# Altium footprint library Connector.PcbLib: 86 footprints (part 1 of 6)
Each footprint in its own frame and in the unit in brackets; x right, y up, seen from the top. Pads: shape width x height; smd on the part's side, far side on the other; paste and mask are expansions set on the pad; w line width, h text height; cw(c..) or ccw(c..) is an arc to the next point about the centre after c.
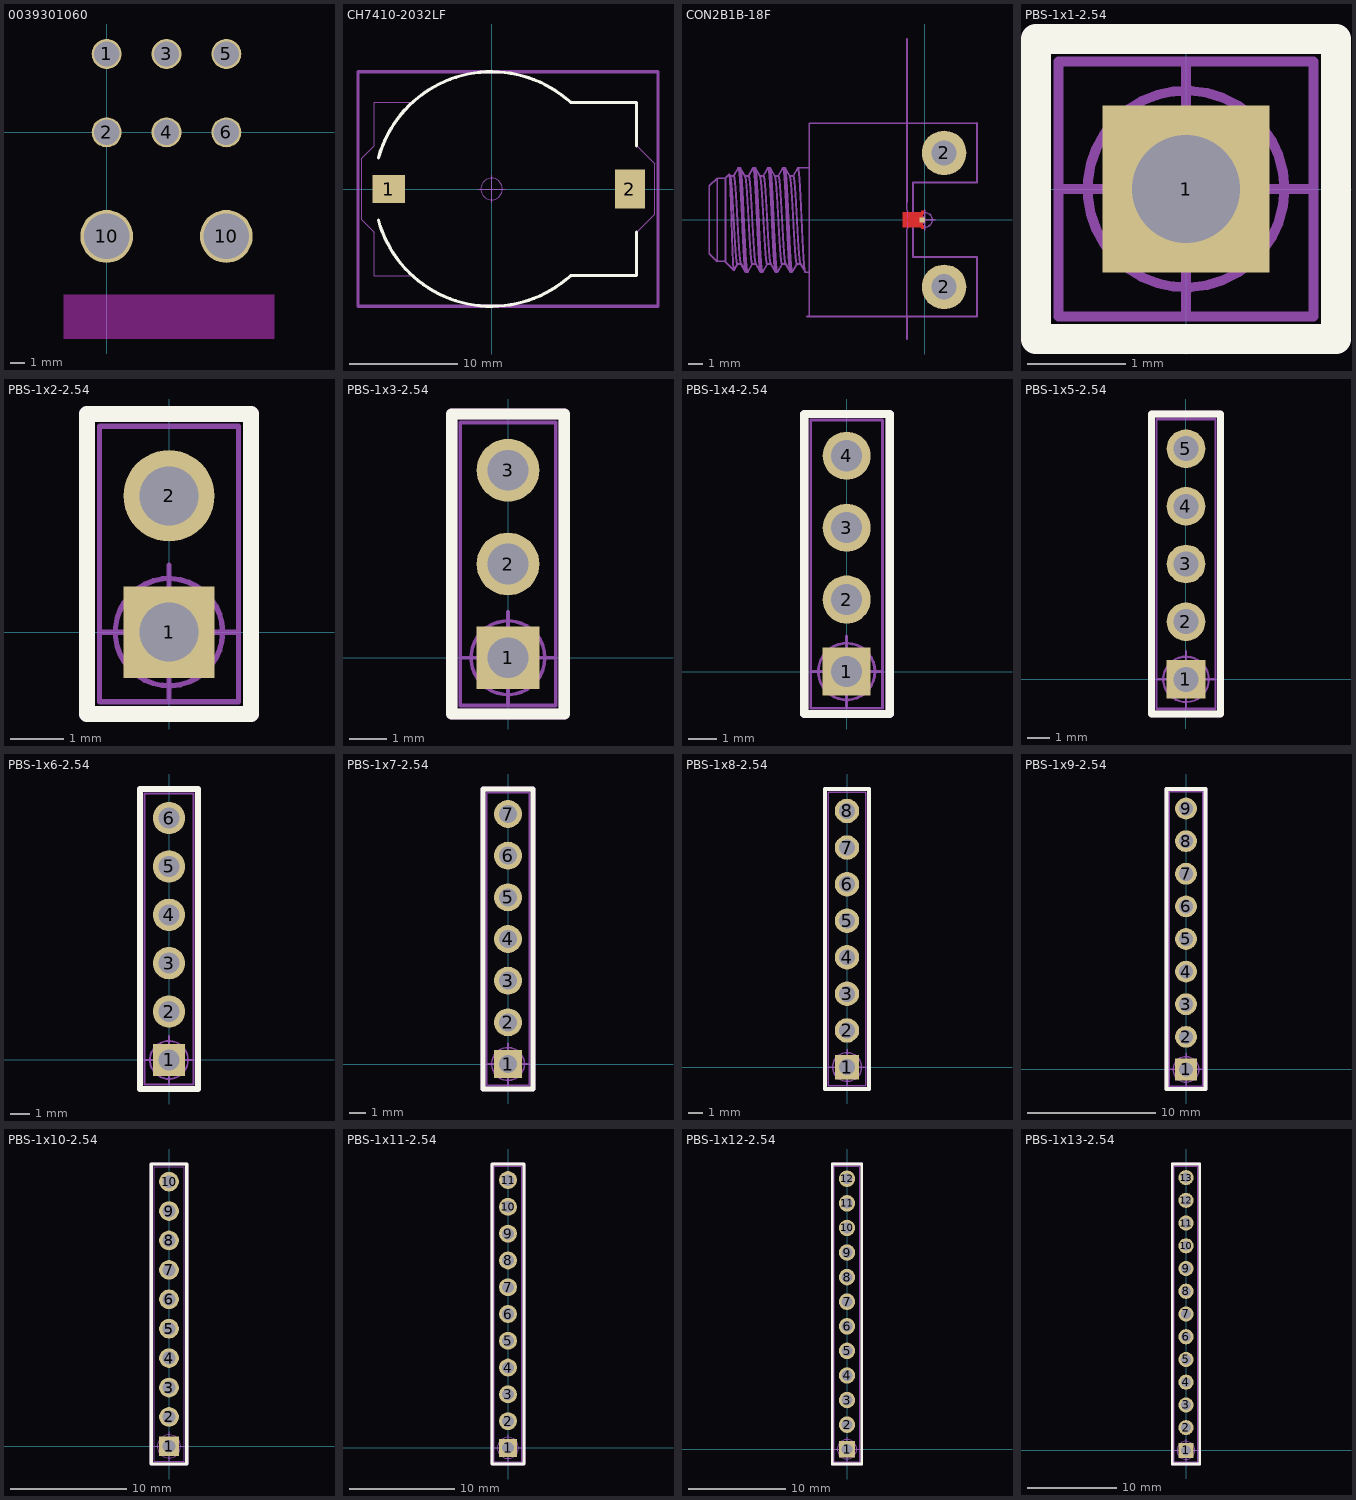
[diagram p0: the footprints below, top view; thin cyan lines are the x and y axes]

## 0039301060 [mm] "0039301060"
pads (8):
  round 2.1 hole 1.78: 1(0,5.5) 2(0,0) 3(4.2,5.5) 4(4.2,0) 5(8.4,5.5) 6(8.4,0)
  round 3.7 hole 3.2: 10(0,-7.3) 10(8.4,-7.3)
Keep-Out Layer:
  board cut-out: 11.75,-11.379 -3,-11.379 -3,-14.5 11.75,-14.5
3D body "39301060.stp": height 11.4, standoff -3.6, extent -2.7,-13.9 11.497,6.035

## CH7410-2032LF [mm]
pads (2):
  rect 3x2.6 smd: 1(-9.5,0)
  rect 2.8x3.6 smd: 2(12.8,0)
Top Overlay:
  lines w0.3: -10.458,-2.873 ccw(c0,0) 7.322,-8.001 13.411,-8.001 13.411,-4 ; -10.451,2.9 cw(c0,0) 7.322,8.001 13.411,8.001 13.411,4
Top Assembly:
  lines w0.1: -7.322,-8.001 ccw(c0,0) 7.288,-8.032 ; -7.304,-8.001 -10.846,-8.001 -10.846,-4 -11.989,-2.857 -11.989,2.857 -10.846,4 -10.846,8.001 -7.304,8.001 ; -7.304,8.018 cw(c0,0) 7.322,8.001 13.411,8.001 13.411,4 15.088,2.324 15.088,-2.324 13.411,-4 13.411,-8.001 7.322,-8.001
Top Component Outline:
  lines w0.3: -12.344,-10.845 15.392,-10.845 15.392,10.843 -12.344,10.843 -12.344,-10.845
Top Component Center:
  circle w0.1: c0,0 r1
  lines w0.1: -1.25,0 1.25,0 ; 0,-1.25 0,1.25
3D body "CH7410-2032LF.STEP": height 5.4, standoff 0, extent -10.852,-8 13.4,8

## CON2B1B-18F [mm]
pads (3):
  rect 0.355x0.355 smd mask+0: 1(-0.178,0)
  round 3 hole 1.7: 2(1.284,-4.5) 2(1.284,4.5)
Top Layer:
  rectangle: -0.259,0.35 -0.05,0.633
  rectangle: -0.259,-0.602 -0.059,-0.35
  region: -0.356,-0.178 -0.162,-0.178 -0.162,0.177 -0.356,0.177 -0.356,0.105 -1.146,0.105 -1.146,-0.105 -0.356,-0.105
  pour cut-out: -0.259,0.501 -1.478,0.501 -1.478,-0.5 -0.259,-0.5 -0.259,-0.35 -0.162,-0.35 -0.162,0.35 -0.259,0.35
Top Solder:
  rectangle: -1.225,-6.5 4,-2.475
  rectangle: -1.225,2.5 4,6.525
Keep-Out Layer:
  lines w0: -1.146,-0.5 -1.146,-0.105 ; -1.146,0.105 -1.146,0.5
Board:
  lines w0.1: -1.216,-6.502 -1.216,-0.71 -1.146,-0.51 -1.146,0.51 -1.214,0.703 -1.214,6.502
Top Assembly:
  drawing of 22333 lines, arcs and shapes, not listed
Bottom Assembly:
  lines w0.13: -1.216,-8 -1.216,-6.502 ; -1.214,1.202 -1.214,11.802 -1.214,12.152
  text "PCB Edge" at -1.873,7.015 h1
Top Component Outline:
  circle w0.127: c1.337,-4.5 r0.85
  circle w0.127: c1.337,4.5 r0.85
  lines w0.127: 1.334,-5.35 ccw(c1.331,-4.5) 1.334,-3.65 ; 1.334,3.65 ccw(c1.331,4.5) 1.334,5.35
Top Component Center:
  circle w0.1: c-0.015,0 r0.5
  lines w0.1: -0.7,0 0.697,0 ; -0.015,-0.706 -0.015,0.691
3D body "型奶.434541.008.STEP": height 5.1, standoff -4.9, extent -14.46,-6.5 3.44,6.5

## PBS-1x1-2.54 [mm]
pads (1):
  rect 1.7x1.7 hole 1.1: 1(0,0)
Top Overlay:
  lines w0.3: -1.524,-1.524 -1.524,1.524 1.524,1.524 1.524,-1.524 -1.524,-1.524
Bottom Overlay:
  lines w0.3: -1.524,-1.524 1.524,-1.524 1.524,1.524 -1.524,1.524 -1.524,-1.524
Top Assembly:
  lines w0.1: -1.295,-1.295 -1.295,1.295 1.295,1.295 1.295,-1.295 -1.295,-1.295
Top Component Outline:
  lines w0.3: -1.524,-1.524 -1.524,1.524 1.524,1.524 1.524,-1.524 -1.524,-1.524
Top Component Center:
  circle w0.1: c0,0 r1
  lines w0.1: -1.25,0 1.25,0 ; 0,-1.25 0,1.25
3D body "PBS-1x1 2.54.stp": height 8.5, standoff -3.2, extent -1.29,-1.27 1.25,1.27

## PBS-1x2-2.54 [mm]
pads (2):
  rect 1.7x1.7 hole 1.1: 1(0,0)
  round 1.7 hole 1.1: 2(0,2.54)
Top Overlay:
  lines w0.3: -1.524,-1.524 1.524,-1.524 1.524,4.064 -1.524,4.064 -1.524,-1.524
Bottom Overlay:
  lines w0.3: -1.524,-1.524 1.524,-1.524 1.524,4.064 -1.524,4.064 -1.524,-1.524
Top Assembly:
  lines w0.1: -1.295,-1.295 1.295,-1.295 1.295,3.835 -1.295,3.835 -1.295,-1.295
Top Component Outline:
  lines w0.3: -1.524,-1.524 1.524,-1.524 1.524,4.064 -1.524,4.064 -1.524,-1.524
Top Component Center:
  circle w0.1: c0,0 r1
  lines w0.1: -1.25,0 1.25,0 ; 0,-1.25 0,1.25
3D body "PBS-1x1 2.54.stp": height 8.5, standoff -3.2, extent -1.245,1.268 1.295,3.808
3D body "PBS-1x1 2.54.stp": height 8.5, standoff -3.2, extent -1.245,-1.272 1.295,1.268

## PBS-1x3-2.54 [mm]
pads (3):
  rect 1.7x1.7 hole 1.1: 1(0,0)
  round 1.7 hole 1.1: 2(0,2.54) 3(0,5.08)
Top Overlay:
  lines w0.3: -1.524,-1.524 -1.524,6.604 1.524,6.604 1.524,-1.524 -1.524,-1.524
Bottom Overlay:
  lines w0.3: -1.524,-1.524 1.524,-1.524 1.524,6.604 -1.524,6.604 -1.524,-1.524
Top Assembly:
  lines w0.1: -1.295,-1.295 1.295,-1.295 1.295,6.375 -1.295,6.375 -1.295,-1.295
Top Component Outline:
  lines w0.3: -1.524,-1.524 1.524,-1.524 1.524,6.604 -1.524,6.604 -1.524,-1.524
Top Component Center:
  circle w0.1: c0,0 r1
  lines w0.1: -1.25,0 1.25,0 ; 0,-1.25 0,1.25
3D body "PBS-1x1 2.54.stp": height 8.5, standoff -3.2, extent -1.245,-1.272 1.295,1.268
3D body "PBS-1x1 2.54.stp": height 8.5, standoff -3.2, extent -1.245,1.268 1.295,3.808
3D body "PBS-1x1 2.54.stp": height 8.5, standoff -3.2, extent -1.245,3.808 1.295,6.348

## PBS-1x4-2.54 [mm]
pads (4):
  rect 1.7x1.7 hole 1.1: 1(0,0)
  round 1.7 hole 1.1: 2(0,2.54) 3(0,5.08) 4(0,7.62)
Top Overlay:
  lines w0.3: -1.499,-1.499 -1.499,9.093 1.524,9.093 1.524,-1.499 -1.499,-1.499
Bottom Overlay:
  lines w0.3: -1.499,-1.499 -1.499,9.093 1.524,9.093 1.524,-1.499 -1.499,-1.499
Top Assembly:
  lines w0.1: -1.27,-1.295 1.266,-1.295 1.266,8.882 -1.27,8.882 -1.27,-1.295
Top Component Outline:
  lines w0.3: -1.499,-1.499 -1.499,9.093 1.524,9.093 1.524,-1.499 -1.499,-1.499
Top Component Center:
  circle w0.1: c0,0 r1
  lines w0.1: -1.25,0 1.25,0 ; 0,-1.25 0,1.25
3D body "PBS-1x1 2.54.stp": height 8.5, standoff -3.2, extent -1.245,6.348 1.295,8.888
3D body "PBS-1x1 2.54.stp": height 8.5, standoff -3.2, extent -1.245,3.808 1.295,6.348
3D body "PBS-1x1 2.54.stp": height 8.5, standoff -3.2, extent -1.245,1.268 1.295,3.808
3D body "PBS-1x1 2.54.stp": height 8.5, standoff -3.2, extent -1.245,-1.272 1.295,1.268

## PBS-1x5-2.54 [mm]
pads (5):
  rect 1.7x1.7 hole 1.1: 1(0,0)
  round 1.7 hole 1.1: 2(0,2.54) 3(0,5.08) 4(0,7.62) 5(0,10.16)
Top Overlay:
  lines w0.3: -1.524,-1.524 -1.524,11.684 1.524,11.684 1.524,-1.524 -1.524,-1.524
Bottom Overlay:
  lines w0.3: -1.524,-1.524 -1.524,11.684 1.524,11.684 1.524,-1.524 -1.524,-1.524
Top Assembly:
  lines w0.1: -1.295,-1.295 -1.295,11.455 1.295,11.455 1.295,-1.295 -1.295,-1.295
Top Component Outline:
  lines w0.3: -1.524,-1.524 -1.524,11.684 1.524,11.684 1.524,-1.524 -1.524,-1.524
Top Component Center:
  circle w0.1: c0,0 r1
  lines w0.1: -1.25,0 1.25,0 ; 0,-1.25 0,1.25
3D body "PBS-1x1 2.54.stp": height 8.5, standoff -3.2, extent -1.245,-1.272 1.295,1.268
3D body "PBS-1x1 2.54.stp": height 8.5, standoff -3.2, extent -1.245,1.268 1.295,3.808
3D body "PBS-1x1 2.54.stp": height 8.5, standoff -3.2, extent -1.245,3.808 1.295,6.348
3D body "PBS-1x1 2.54.stp": height 8.5, standoff -3.2, extent -1.245,6.348 1.295,8.888
3D body "PBS-1x1 2.54.stp": height 8.5, standoff -3.2, extent -1.245,8.888 1.295,11.428

## PBS-1x6-2.54 [mm]
pads (6):
  rect 1.7x1.7 hole 1.1: 1(0,0)
  round 1.7 hole 1.1: 2(0,2.54) 3(0,5.08) 4(0,7.62) 5(0,10.16) 6(0,12.7)
Top Overlay:
  lines w0.3: -1.524,-1.524 -1.524,14.224 1.524,14.224 1.524,-1.524 -1.524,-1.524
Bottom Overlay:
  lines w0.3: -1.524,-1.524 1.524,-1.524 1.524,14.224 -1.524,14.224 -1.524,-1.524
Top Assembly:
  lines w0.1: -1.295,-1.295 1.295,-1.295 1.295,13.995 -1.295,13.995 -1.295,-1.295
Top Component Outline:
  lines w0.3: -1.524,-1.524 -1.524,14.224 1.524,14.224 1.524,-1.524 -1.524,-1.524
Top Component Center:
  circle w0.1: c0,0 r1
  lines w0.1: -1.25,0 1.25,0 ; 0,-1.25 0,1.25
3D body "PBS-1x1 2.54.stp": height 8.5, standoff -3.2, extent -1.245,11.428 1.295,13.968
3D body "PBS-1x1 2.54.stp": height 8.5, standoff -3.2, extent -1.245,8.888 1.295,11.428
3D body "PBS-1x1 2.54.stp": height 8.5, standoff -3.2, extent -1.245,6.348 1.295,8.888
3D body "PBS-1x1 2.54.stp": height 8.5, standoff -3.2, extent -1.245,3.808 1.295,6.348
3D body "PBS-1x1 2.54.stp": height 8.5, standoff -3.2, extent -1.245,1.268 1.295,3.808
3D body "PBS-1x1 2.54.stp": height 8.5, standoff -3.2, extent -1.245,-1.272 1.295,1.268

## PBS-1x7-2.54 [mm]
pads (7):
  rect 1.7x1.7 hole 1.1: 1(0,0)
  round 1.7 hole 1.1: 2(0,2.54) 3(0,5.08) 4(0,7.62) 5(0,10.16) 6(0,12.7) 7(0,15.24)
Top Overlay:
  lines w0.3: -1.524,-1.524 -1.524,16.764 1.524,16.764 1.524,-1.524 -1.524,-1.524
Bottom Overlay:
  lines w0.3: -1.524,-1.524 1.524,-1.524 1.524,16.764 -1.524,16.764 -1.524,-1.524
Top Assembly:
  lines w0.1: -1.295,-1.295 1.295,-1.295 1.295,16.535 -1.295,16.535 -1.295,-1.295
Top Component Outline:
  lines w0.3: -1.524,-1.524 -1.524,16.764 1.524,16.764 1.524,-1.524 -1.524,-1.524
Top Component Center:
  circle w0.1: c0,0 r1
  lines w0.1: -1.25,0 1.25,0 ; 0,-1.25 0,1.25
3D body "PBS-1x1 2.54.stp": height 8.5, standoff -3.2, extent -1.245,-1.272 1.295,1.268
3D body "PBS-1x1 2.54.stp": height 8.5, standoff -3.2, extent -1.245,1.268 1.295,3.808
3D body "PBS-1x1 2.54.stp": height 8.5, standoff -3.2, extent -1.245,3.808 1.295,6.348
3D body "PBS-1x1 2.54.stp": height 8.5, standoff -3.2, extent -1.245,6.348 1.295,8.888
3D body "PBS-1x1 2.54.stp": height 8.5, standoff -3.2, extent -1.245,8.888 1.295,11.428
3D body "PBS-1x1 2.54.stp": height 8.5, standoff -3.2, extent -1.245,11.428 1.295,13.968
3D body "PBS-1x1 2.54.stp": height 8.5, standoff -3.2, extent -1.245,13.968 1.295,16.508

## PBS-1x8-2.54 [mm]
pads (8):
  rect 1.7x1.7 hole 1.1: 1(0,0)
  round 1.7 hole 1.1: 2(0,2.54) 3(0,5.08) 4(0,7.62) 5(0,10.16) 6(0,12.7) 7(0,15.24) 8(0,17.78)
Top Overlay:
  lines w0.3: -1.524,-1.524 1.524,-1.524 1.524,19.304 -1.524,19.304 -1.524,-1.524
Bottom Overlay:
  lines w0.3: -1.524,-1.524 -1.524,19.304 1.524,19.304 1.524,-1.524 -1.524,-1.524
Top Assembly:
  lines w0.1: -1.295,-1.295 -1.295,19.075 1.295,19.075 1.295,-1.295 -1.295,-1.295
Top Component Outline:
  lines w0.3: -1.524,-1.524 1.524,-1.524 1.524,19.304 -1.524,19.304 -1.524,-1.524
Top Component Center:
  circle w0.1: c0,0 r1
  lines w0.1: -1.25,0 1.25,0 ; 0,-1.25 0,1.25
3D body "PBS-1x1 2.54.stp": height 8.5, standoff -3.2, extent -1.245,16.508 1.295,19.048
3D body "PBS-1x1 2.54.stp": height 8.5, standoff -3.2, extent -1.245,13.968 1.295,16.508
3D body "PBS-1x1 2.54.stp": height 8.5, standoff -3.2, extent -1.245,11.428 1.295,13.968
3D body "PBS-1x1 2.54.stp": height 8.5, standoff -3.2, extent -1.245,8.888 1.295,11.428
3D body "PBS-1x1 2.54.stp": height 8.5, standoff -3.2, extent -1.245,6.348 1.295,8.888
3D body "PBS-1x1 2.54.stp": height 8.5, standoff -3.2, extent -1.245,3.808 1.295,6.348
3D body "PBS-1x1 2.54.stp": height 8.5, standoff -3.2, extent -1.245,1.268 1.295,3.808
3D body "PBS-1x1 2.54.stp": height 8.5, standoff -3.2, extent -1.245,-1.272 1.295,1.268

## PBS-1x9-2.54 [mm]
pads (9):
  rect 1.7x1.7 hole 1.1: 1(0,0)
  round 1.7 hole 1.1: 2(0,2.54) 3(0,5.08) 4(0,7.62) 5(0,10.16) 6(0,12.7) 7(0,15.24) 8(0,17.78) 9(0,20.32)
Top Overlay:
  lines w0.3: -1.524,-1.524 1.524,-1.524 1.524,21.844 -1.524,21.844 -1.524,-1.524
Bottom Overlay:
  lines w0.3: -1.524,-1.524 -1.524,21.844 1.524,21.844 1.524,-1.524 -1.524,-1.524
Top Assembly:
  lines w0.1: -1.295,-1.295 1.295,-1.295 1.295,21.615 -1.295,21.615 -1.295,-1.295
Top Component Outline:
  lines w0.3: -1.524,-1.524 1.524,-1.524 1.524,21.844 -1.524,21.844 -1.524,-1.524
Top Component Center:
  circle w0.1: c0,0 r1
  lines w0.1: -1.25,0 1.25,0 ; 0,-1.25 0,1.25
3D body "PBS-1x1 2.54.stp": height 8.5, standoff -3.2, extent -1.245,19.048 1.295,21.588
3D body "PBS-1x1 2.54.stp": height 8.5, standoff -3.2, extent -1.245,16.508 1.295,19.048
3D body "PBS-1x1 2.54.stp": height 8.5, standoff -3.2, extent -1.245,13.968 1.295,16.508
3D body "PBS-1x1 2.54.stp": height 8.5, standoff -3.2, extent -1.245,11.428 1.295,13.968
3D body "PBS-1x1 2.54.stp": height 8.5, standoff -3.2, extent -1.245,8.888 1.295,11.428
3D body "PBS-1x1 2.54.stp": height 8.5, standoff -3.2, extent -1.245,6.348 1.295,8.888
3D body "PBS-1x1 2.54.stp": height 8.5, standoff -3.2, extent -1.245,3.808 1.295,6.348
3D body "PBS-1x1 2.54.stp": height 8.5, standoff -3.2, extent -1.245,1.268 1.295,3.808
3D body "PBS-1x1 2.54.stp": height 8.5, standoff -3.2, extent -1.245,-1.272 1.295,1.268

## PBS-1x10-2.54 [mm]
pads (10):
  rect 1.7x1.7 hole 1.1: 1(0,0)
  round 1.7 hole 1.1: 2(0,2.54) 3(0,5.08) 4(0,7.62) 5(0,10.16) 6(0,12.7) 7(0,15.24) 8(0,17.78) 9(0,20.32) 10(0,22.86)
Top Overlay:
  lines w0.3: -1.524,-1.524 1.524,-1.524 1.524,24.384 -1.524,24.384 -1.524,-1.524
Bottom Overlay:
  lines w0.3: -1.524,-1.524 -1.524,24.384 1.524,24.384 1.524,-1.524 -1.524,-1.524
Top Assembly:
  lines w0.1: -1.295,-1.295 -1.295,24.155 1.295,24.155 1.295,-1.295 -1.295,-1.295
Top Component Outline:
  lines w0.3: -1.524,-1.524 1.524,-1.524 1.524,24.384 -1.524,24.384 -1.524,-1.524
Top Component Center:
  circle w0.1: c0,0 r1
  lines w0.1: -1.25,0 1.25,0 ; 0,-1.25 0,1.25
3D body "PBS-1x1 2.54.stp": height 8.5, standoff -3.2, extent -1.245,21.588 1.295,24.128
3D body "PBS-1x1 2.54.stp": height 8.5, standoff -3.2, extent -1.245,19.048 1.295,21.588
3D body "PBS-1x1 2.54.stp": height 8.5, standoff -3.2, extent -1.245,16.508 1.295,19.048
3D body "PBS-1x1 2.54.stp": height 8.5, standoff -3.2, extent -1.245,13.968 1.295,16.508
3D body "PBS-1x1 2.54.stp": height 8.5, standoff -3.2, extent -1.245,11.428 1.295,13.968
3D body "PBS-1x1 2.54.stp": height 8.5, standoff -3.2, extent -1.245,8.888 1.295,11.428
3D body "PBS-1x1 2.54.stp": height 8.5, standoff -3.2, extent -1.245,6.348 1.295,8.888
3D body "PBS-1x1 2.54.stp": height 8.5, standoff -3.2, extent -1.245,3.808 1.295,6.348
3D body "PBS-1x1 2.54.stp": height 8.5, standoff -3.2, extent -1.245,1.268 1.295,3.808
3D body "PBS-1x1 2.54.stp": height 8.5, standoff -3.2, extent -1.245,-1.272 1.295,1.268

## PBS-1x11-2.54 [mm]
pads (11):
  rect 1.7x1.7 hole 1.1: 1(0,0)
  round 1.7 hole 1.1: 2(0,2.54) 3(0,5.08) 4(0,7.62) 5(0,10.16) 6(0,12.7) 7(0,15.24) 8(0,17.78) 9(0,20.32) 10(0,22.86) 11(0,25.4)
Top Overlay:
  lines w0.3: -1.524,-1.524 1.524,-1.524 1.524,26.924 -1.524,26.924 -1.524,-1.524
Bottom Overlay:
  lines w0.3: -1.524,-1.524 1.524,-1.524 1.524,26.924 -1.524,26.924 -1.524,-1.524
Top Assembly:
  lines w0.1: -1.295,-1.295 1.295,-1.295 1.295,26.695 -1.295,26.695 -1.295,-1.295
Top Component Outline:
  lines w0.3: -1.524,-1.524 1.524,-1.524 1.524,26.924 -1.524,26.924 -1.524,-1.524
Top Component Center:
  circle w0.1: c0,0 r1
  lines w0.1: -1.25,0 1.25,0 ; 0,-1.25 0,1.25
3D body "PBS-1x1 2.54.stp": height 8.5, standoff -3.2, extent -1.245,-1.272 1.295,1.268
3D body "PBS-1x1 2.54.stp": height 8.5, standoff -3.2, extent -1.245,1.268 1.295,3.808
3D body "PBS-1x1 2.54.stp": height 8.5, standoff -3.2, extent -1.245,3.808 1.295,6.348
3D body "PBS-1x1 2.54.stp": height 8.5, standoff -3.2, extent -1.245,6.348 1.295,8.888
3D body "PBS-1x1 2.54.stp": height 8.5, standoff -3.2, extent -1.245,8.888 1.295,11.428
3D body "PBS-1x1 2.54.stp": height 8.5, standoff -3.2, extent -1.245,11.428 1.295,13.968
3D body "PBS-1x1 2.54.stp": height 8.5, standoff -3.2, extent -1.245,13.968 1.295,16.508
3D body "PBS-1x1 2.54.stp": height 8.5, standoff -3.2, extent -1.245,16.508 1.295,19.048
3D body "PBS-1x1 2.54.stp": height 8.5, standoff -3.2, extent -1.245,19.048 1.295,21.588
3D body "PBS-1x1 2.54.stp": height 8.5, standoff -3.2, extent -1.245,21.588 1.295,24.128
3D body "PBS-1x1 2.54.stp": height 8.5, standoff -3.2, extent -1.245,24.128 1.295,26.668

## PBS-1x12-2.54 [mm]
pads (12):
  rect 1.7x1.7 hole 1.1: 1(0,0)
  round 1.7 hole 1.1: 2(0,2.54) 3(0,5.08) 4(0,7.62) 5(0,10.16) 6(0,12.7) 7(0,15.24) 8(0,17.78) 9(0,20.32) 10(0,22.86) 11(0,25.4) 12(0,27.94)
Top Overlay:
  lines w0.3: -1.524,-1.524 -1.524,29.464 1.524,29.464 1.524,-1.524 -1.524,-1.524
Bottom Overlay:
  lines w0.3: -1.524,-1.524 -1.524,29.464 1.524,29.464 1.524,-1.524 -1.524,-1.524
Top Assembly:
  lines w0.1: -1.295,-1.295 1.295,-1.295 1.295,29.235 -1.295,29.235 -1.295,-1.295
Top Component Outline:
  lines w0.3: -1.524,-1.524 -1.524,29.464 1.524,29.464 1.524,-1.524 -1.524,-1.524
Top Component Center:
  circle w0.1: c0,0 r1
  lines w0.1: -1.25,0 1.25,0 ; 0,-1.25 0,1.25
3D body "PBS-1x1 2.54.stp": height 8.5, standoff -3.2, extent -1.245,26.668 1.295,29.208
3D body "PBS-1x1 2.54.stp": height 8.5, standoff -3.2, extent -1.245,24.128 1.295,26.668
3D body "PBS-1x1 2.54.stp": height 8.5, standoff -3.2, extent -1.245,21.588 1.295,24.128
3D body "PBS-1x1 2.54.stp": height 8.5, standoff -3.2, extent -1.245,19.048 1.295,21.588
3D body "PBS-1x1 2.54.stp": height 8.5, standoff -3.2, extent -1.245,16.508 1.295,19.048
3D body "PBS-1x1 2.54.stp": height 8.5, standoff -3.2, extent -1.245,13.968 1.295,16.508
3D body "PBS-1x1 2.54.stp": height 8.5, standoff -3.2, extent -1.245,11.428 1.295,13.968
3D body "PBS-1x1 2.54.stp": height 8.5, standoff -3.2, extent -1.245,8.888 1.295,11.428
3D body "PBS-1x1 2.54.stp": height 8.5, standoff -3.2, extent -1.245,6.348 1.295,8.888
3D body "PBS-1x1 2.54.stp": height 8.5, standoff -3.2, extent -1.245,3.808 1.295,6.348
3D body "PBS-1x1 2.54.stp": height 8.5, standoff -3.2, extent -1.245,1.268 1.295,3.808
3D body "PBS-1x1 2.54.stp": height 8.5, standoff -3.2, extent -1.245,-1.272 1.295,1.268

## PBS-1x13-2.54 [mm]
pads (13):
  rect 1.7x1.7 hole 1.1: 1(0,0)
  round 1.7 hole 1.1: 2(0,2.54) 3(0,5.08) 4(0,7.62) 5(0,10.16) 6(0,12.7) 7(0,15.24) 8(0,17.78) 9(0,20.32) 10(0,22.86) 11(0,25.4) 12(0,27.94) 13(0,30.48)
Top Overlay:
  lines w0.3: -1.524,-1.524 1.524,-1.524 1.524,32.004 -1.524,32.004 -1.524,-1.524
Bottom Overlay:
  lines w0.3: -1.524,-1.524 1.524,-1.524 1.524,32.004 -1.524,32.004 -1.524,-1.524
Top Assembly:
  lines w0.1: -1.295,-1.295 1.295,-1.295 1.295,31.775 -1.295,31.775 -1.295,-1.295
Top Component Outline:
  lines w0.3: -1.524,-1.524 1.524,-1.524 1.524,32.004 -1.524,32.004 -1.524,-1.524
Top Component Center:
  circle w0.1: c0,0 r1
  lines w0.1: -1.25,0 1.25,0 ; 0,-1.25 0,1.25
3D body "PBS-1x1 2.54.stp": height 8.5, standoff -3.2, extent -1.245,-1.272 1.295,1.268
3D body "PBS-1x1 2.54.stp": height 8.5, standoff -3.2, extent -1.245,1.268 1.295,3.808
3D body "PBS-1x1 2.54.stp": height 8.5, standoff -3.2, extent -1.245,3.808 1.295,6.348
3D body "PBS-1x1 2.54.stp": height 8.5, standoff -3.2, extent -1.245,6.348 1.295,8.888
3D body "PBS-1x1 2.54.stp": height 8.5, standoff -3.2, extent -1.245,8.888 1.295,11.428
3D body "PBS-1x1 2.54.stp": height 8.5, standoff -3.2, extent -1.245,11.428 1.295,13.968
3D body "PBS-1x1 2.54.stp": height 8.5, standoff -3.2, extent -1.245,13.968 1.295,16.508
3D body "PBS-1x1 2.54.stp": height 8.5, standoff -3.2, extent -1.245,16.508 1.295,19.048
3D body "PBS-1x1 2.54.stp": height 8.5, standoff -3.2, extent -1.245,19.048 1.295,21.588
3D body "PBS-1x1 2.54.stp": height 8.5, standoff -3.2, extent -1.245,21.588 1.295,24.128
3D body "PBS-1x1 2.54.stp": height 8.5, standoff -3.2, extent -1.245,24.128 1.295,26.668
3D body "PBS-1x1 2.54.stp": height 8.5, standoff -3.2, extent -1.245,26.668 1.295,29.208
3D body "PBS-1x1 2.54.stp": height 8.5, standoff -3.2, extent -1.245,29.208 1.295,31.748